# Altium footprint library SMT.PcbLib: 151 footprints (part 9 of 10)
Each footprint in its own frame and in the unit in brackets; x right, y up, seen from the top. Pads: shape width x height; smd on the part's side, far side on the other; paste and mask are expansions set on the pad; w line width, h text height; cw(c..) or ccw(c..) is an arc to the next point about the centre after c.
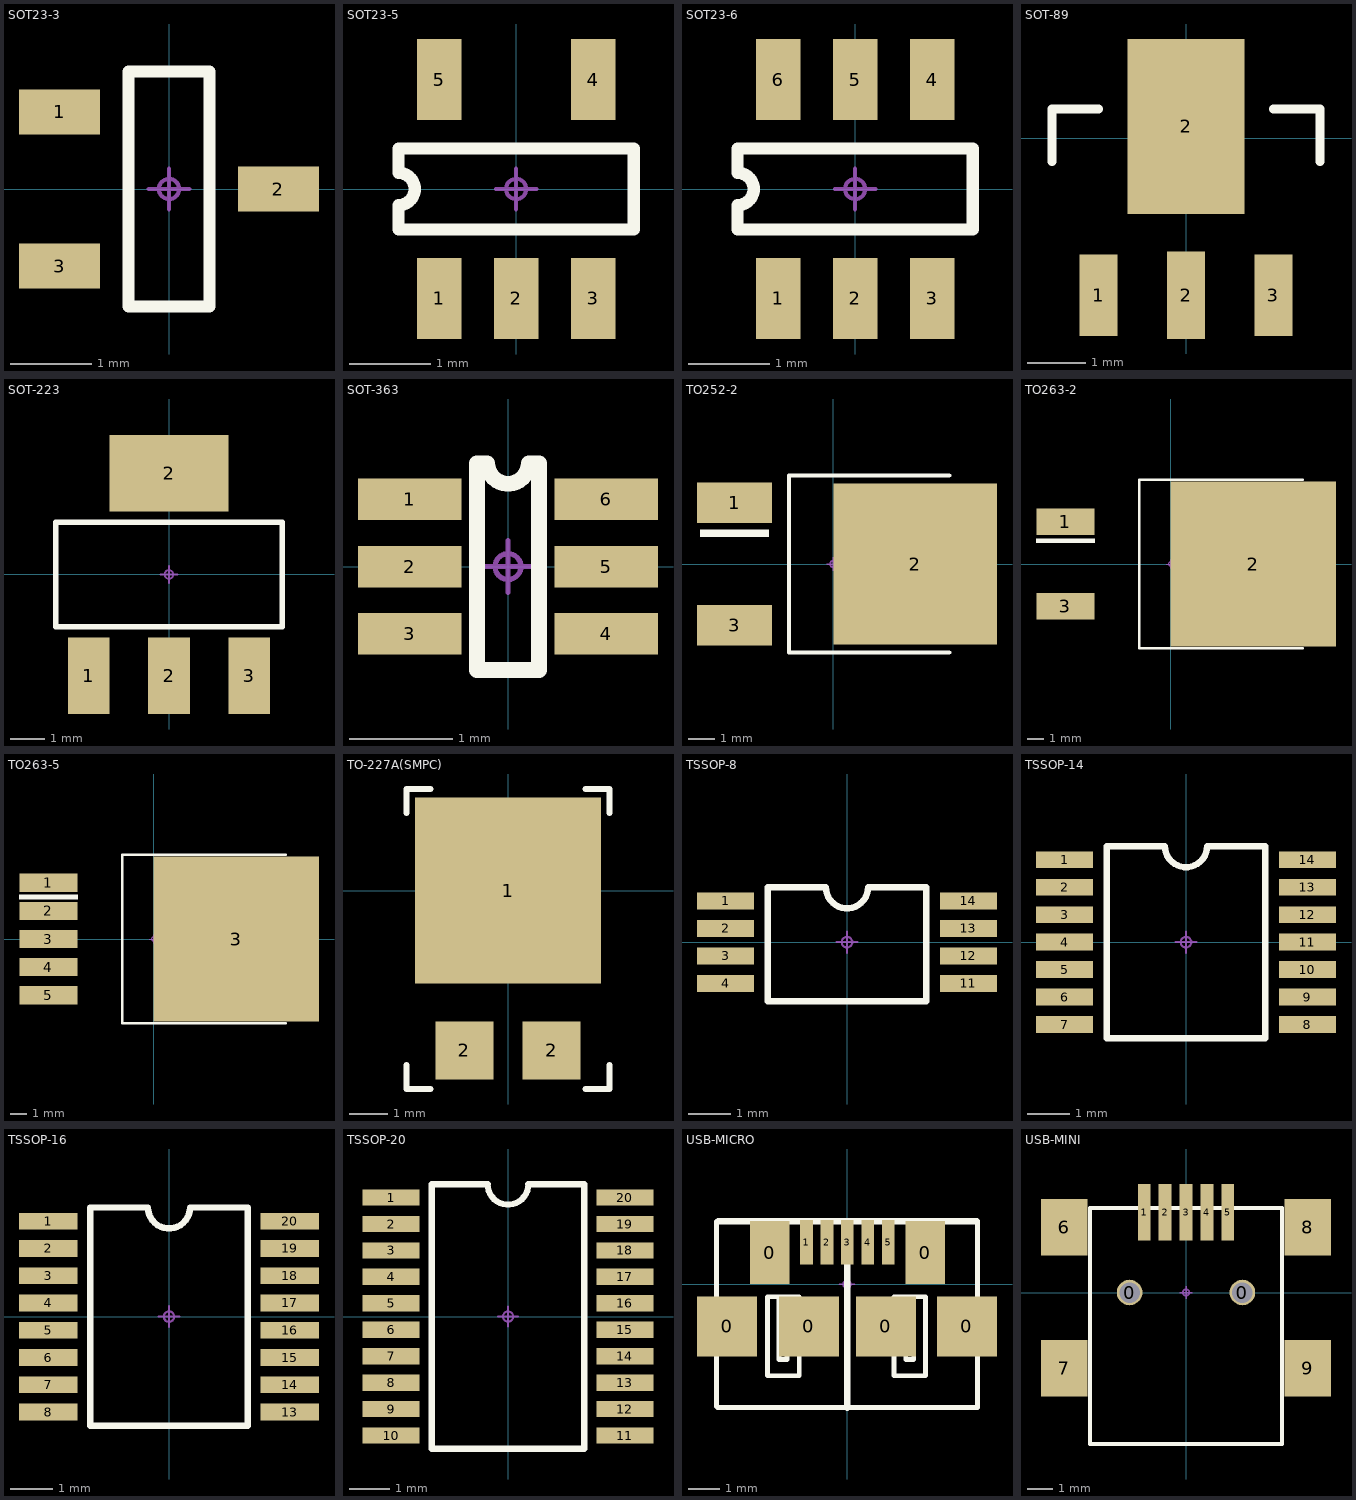
[diagram p8: the footprints below, top view; thin cyan lines are the x and y axes]

## SOT23-3 [mm]
pads (3):
  rect 1x0.55 smd paste-0.02: 1(-1.35,0.95) 2(1.35,0) 3(-1.35,-0.95)
Top Overlay:
  lines w0.152: -0.5,-1.45 0.5,-1.45 0.5,1.45 -0.5,1.45 -0.5,-1.45
Mechanical 15:
  circle w0.05: c0,0 r0.125
  lines w0.05: -0.25,0 0.25,0 ; 0,-0.25 0,0.25
3D body "SW3dPS-sot-3p290x130ll237h100.STEP": height 1, standoff 0, extent -1.16,-1.45 1.21,1.45

## SOT23-5 [mm]
pads (5):
  rect 0.55x1 smd paste-0.02: 1(-0.95,-1.35) 2(0,-1.35) 3(0.95,-1.35) 4(0.95,1.35) 5(-0.95,1.35)
Top Overlay:
  lines w0.152: -1.45,-0.5 -1.45,-0.2 ccw(c-1.45,0) -1.45,0.2 -1.45,0.5 1.45,0.5 1.45,-0.5 -1.45,-0.5
Mechanical 15:
  circle w0.05: c0,0 r0.125
  lines w0.05: -0.25,0 0.25,0 ; 0,-0.25 0,0.25
3D body "User Library-SOT23-5-2.STEP": height 1.45, standoff 0, extent -1.45,-1.4 1.45,1.4

## SOT23-6 [mm]
pads (6):
  rect 0.55x1 smd paste-0.02: 1(-0.95,-1.35) 2(0,-1.35) 3(0.95,-1.35) 4(0.95,1.35) 5(0,1.35) 6(-0.95,1.35)
Top Overlay:
  lines w0.152: -1.45,-0.5 1.45,-0.5 1.45,0.5 -1.45,0.5 -1.45,0.2 cw(c-1.45,0) -1.45,-0.2 -1.45,-0.5
Mechanical 15:
  circle w0.05: c0,0 r0.125
  lines w0.05: -0.25,0 0.25,0 ; 0,-0.25 0,0.25
3D body "SOT23-6.stp": height 1.3, standoff 0, extent -1.5,-1.5 1.5,1.5

## SOT-89 [mm]
pads (4):
  rect 0.65x1.4 smd paste-0.02: 1(-1.5,-2.7) 3(1.5,-2.7)
  rect 0.65x1.5 smd paste-0.02: 2(0,-2.7)
  rect 2x3 smd paste-0.1: 2(0,0.2)
Top Overlay:
  lines w0.152: -2.3,-0.4 -2.3,0.5 -1.5,0.5 ; 1.5,0.5 2.3,0.5 2.3,-0.4
Mechanical 15:
  circle w0.05: c0,0 r0.125
  lines w0.05: -0.25,0 0.25,0 ; 0,-0.25 0,0.25
3D body "SOT-89.STEP": height 1.51, standoff 0, extent -2.25,-3.1 2.25,1.2

## SOT-223 [mm]
pads (4):
  rect 1.2x2.2 smd paste-0.1: 1(-2.3,-2.9) 2(0,-2.9) 3(2.3,-2.9)
  rect 3.4x2.2 smd paste-0.2: 2(0,2.9)
Top Overlay:
  lines w0.152: -3.25,-1.5 3.25,-1.5 3.25,1.5 -3.25,1.5 -3.25,-1.5
Mechanical 15:
  circle w0.05: c0,0 r0.125
  lines w0.05: -0.25,0 0.25,0 ; 0,-0.25 0,0.25
3D body "SOT223-4.STEP": height 1.8, standoff 0, extent -3.35,-3.65 3.35,3.65

## SOT-363 [mm]
pads (6):
  rect 1x0.4 smd: 1(-0.95,0.65) 2(-0.95,0) 3(-0.95,-0.65) 4(0.95,-0.65) 5(0.95,0) 6(0.95,0.65)
Top Overlay:
  lines w0.152: -0.3,-1 0.3,-1 0.3,1 0.2,1 cw(c0,1) -0.2,1 -0.3,1 -0.3,-1
Mechanical 15:
  circle w0.05: c0,0 r0.125
  lines w0.05: -0.25,0 0.25,0 ; 0,-0.25 0,0.25
Mechanical 18:
  text "4" at 1.27,-0.381 h0.64
  text "5" at 1.27,0.254 h0.64
3D body "sot363pad.stp": height 0, standoff 0, extent -1.524,0.434 -0.508,0.866
3D body "sot363pad.stp": height 0, standoff 0, extent -1.524,-0.216 -0.508,0.216
3D body "sot363pad.stp": height 0, standoff 0, extent -1.524,-0.866 -0.508,-0.434
3D body "sot363pad.stp": height 0, standoff 0, extent 0.508,0.434 1.524,0.866
3D body "sot363pad.stp": height 0, standoff 0, extent 0.508,-0.216 1.524,0.216
3D body "sot363pad.stp": height 0, standoff 0, extent 0.508,-0.866 1.524,-0.434
3D body "sot363.stp": height 1.1, standoff -0.01, extent -1.025,-1 1.025,1

## TO252-2 [mm]
height 2.39
pads (3):
  rect 2.8x1.5 smd paste-0.1: 1(-3.683,2.286) 3(-3.683,-2.286)
  rect 6.1x6 smd paste-3.1: 2(3.048,0)
Top Overlay:
  region: -4.953,1.016 -2.413,1.016 -2.413,1.27 -4.953,1.27
  lines w0.152: 4.318,-3.302 -1.651,-3.302 -1.651,3.302 4.318,3.302
Top Paste:
  rectangle: 4,-2.8 5.2,-1.8
  rectangle: 4,-1.3 5.3,-0.3
  rectangle: 4,0.3 5.3,1.3
  rectangle: 4,1.9 5.3,2.9
  rectangle: 2.2,1.9 3.5,2.9
  rectangle: 2.2,0.3 3.5,1.3
  rectangle: 2.2,-1.3 3.5,-0.3
  rectangle: 2.2,-2.8 3.4,-1.8
  rectangle: 0.5,-2.8 1.8,-1.8
  rectangle: 0.5,-1.316 1.8,-0.3
  rectangle: 0.5,1.9 1.8,2.9
  rectangle: 0.5,0.3 1.8,1.3
Mechanical 15:
  circle w0.05: c0,0 r0.125
  lines w0.05: -0.25,0 0.25,0 ; 0,-0.25 0,0.25
3D body "td03b.stp": height 2.48, standoff 0.01, extent -4.122,-3.29 5.577,3.29

## TO263-2 [mm]
height 4.5
pads (3):
  rect 3.5x1.6 smd paste-0.1: 1(-6.35,2.54) 3(-6.35,-2.54)
  rect 10x10 smd paste-5: 2(5,0)
Top Overlay:
  region: -8.128,1.27 -4.572,1.27 -4.572,1.524 -8.128,1.524
  lines w0.152: 8,-5.1 -1.9,-5.1 -1.9,5.1 8,5.1
Top Paste:
  rectangle: 8.4,3.6 9.9,4.6
  rectangle: 8.4,2 9.9,3
  rectangle: 8.4,0.5 9.9,1.5
  rectangle: 8.4,-1.5 9.9,-0.5
  rectangle: 8.4,-3 9.9,-2
  rectangle: 8.4,-4.5 9.9,-3.5
  rectangle: 6.4,-4.5 7.9,-3.5
  rectangle: 6.4,-3 7.9,-2
  rectangle: 6.4,-1.5 7.9,-0.5
  rectangle: 6.4,0.5 7.9,1.5
  rectangle: 6.4,2 7.9,3
  rectangle: 6.4,3.6 7.9,4.6
  rectangle: 4.4,3.6 5.9,4.6
  rectangle: 4.4,2 5.9,3
  rectangle: 4.4,0.5 5.9,1.5
  rectangle: 4.4,-1.5 5.9,-0.5
  rectangle: 4.4,-3 5.9,-2
  rectangle: 4.4,-4.5 5.9,-3.5
  rectangle: 2.4,-4.5 3.9,-3.5
  rectangle: 2.4,-3 3.9,-2
  rectangle: 2.4,-1.5 3.9,-0.5
  rectangle: 2.4,0.5 3.9,1.5
  rectangle: 2.4,2 3.9,3
  rectangle: 2.4,3.6 3.9,4.6
  rectangle: 0.4,3.6 1.9,4.6
  rectangle: 0.4,2 1.9,3
  rectangle: 0.4,-1.5 1.9,-0.5
  rectangle: 0.4,-3 1.9,-2
  rectangle: 0.4,-4.5 1.9,-3.5
  rectangle: 0.4,0.5 1.9,1.5
Mechanical 15:
  circle w0.05: c0,0 r0.125
  lines w0.05: -0.25,0 0.25,0 ; 0,-0.25 0,0.25
3D body "SW3dPS-TO263-3.STEP": height 4.88, standoff 0.08, extent -6.819,-5.055 8.851,4.945

## TO263-5 [mm]
height 4.5
pads (6):
  rect 3.5x1.1 smd: 1(-6.35,3.4) 2(-6.35,1.7) 3(-6.35,0) 4(-6.35,-1.7) 5(-6.35,-3.4)
  rect 10x10 smd paste-5: 3(5,0)
Top Overlay:
  region: -8.128,2.39 -4.572,2.39 -4.572,2.667 -8.128,2.667
  lines w0.152: 8,-5.1 -1.9,-5.1 -1.9,5.1 8,5.1
Top Paste:
  rectangle: 0.4,0.5 1.9,1.5
  rectangle: 0.4,-4.5 1.9,-3.5
  rectangle: 0.4,-3 1.9,-2
  rectangle: 0.4,-1.5 1.9,-0.5
  rectangle: 0.4,2 1.9,3
  rectangle: 0.4,3.6 1.9,4.6
  rectangle: 2.4,3.6 3.9,4.6
  rectangle: 2.4,2 3.9,3
  rectangle: 2.4,0.5 3.9,1.5
  rectangle: 2.4,-1.5 3.9,-0.5
  rectangle: 2.4,-3 3.9,-2
  rectangle: 2.4,-4.5 3.9,-3.5
  rectangle: 4.4,-4.5 5.9,-3.5
  rectangle: 4.4,-3 5.9,-2
  rectangle: 4.4,-1.5 5.9,-0.5
  rectangle: 4.4,0.5 5.9,1.5
  rectangle: 4.4,2 5.9,3
  rectangle: 4.4,3.6 5.9,4.6
  rectangle: 6.4,3.6 7.9,4.6
  rectangle: 6.4,2 7.9,3
  rectangle: 6.4,0.5 7.9,1.5
  rectangle: 6.4,-1.5 7.9,-0.5
  rectangle: 6.4,-3 7.9,-2
  rectangle: 6.4,-4.5 7.9,-3.5
  rectangle: 8.4,-4.5 9.9,-3.5
  rectangle: 8.4,-3 9.9,-2
  rectangle: 8.4,-1.5 9.9,-0.5
  rectangle: 8.4,0.5 9.9,1.5
  rectangle: 8.4,2 9.9,3
  rectangle: 8.4,3.6 9.9,4.6
Mechanical 15:
  circle w0.05: c0,0 r0.125
  lines w0.05: -0.25,0 0.25,0 ; 0,-0.25 0,0.25
3D body "to-263-5.stp": height 4.65, standoff -0.01, extent -6.698,-5.205 5.715,5.205

## TO-227A(SMPC) [mm]
pads (3):
  rect 4.8x4.8 smd paste-0.5: 1(0,0)
  rect 1.5x1.5 smd paste-0.1: 2(-1.125,-4.125) 2(1.125,-4.125)
Top Overlay:
  lines w0.152: -2.625,-4.5 -2.625,-5.125 -2,-5.125 ; -2.625,2 -2.625,2.625 -2,2.625 ; 2,-5.125 2.625,-5.125 2.625,-4.5 ; 2,2.625 2.625,2.625 2.625,2
Mechanical 16:
  circle w0.02: c0,-1.125 r0.125
  lines w0.02: -0.25,-1.125 0.25,-1.125 ; 0,-1.375 0,-0.875
3D body "SW3dPS-TO-277A(SMPC).STEP": height 1.2, standoff 0, extent -2.375,-4.45 2.375,2.2

## TSSOP-8 [mm]
height 1.2
pads (8):
  rect 1.35x0.4 smd paste-0.02: 1(-2.875,0.975) 2(-2.875,0.325) 3(-2.875,-0.325) 4(-2.875,-0.975) 11(2.875,-0.975) 12(2.875,-0.325) 13(2.875,0.325) 14(2.875,0.975)
Top Overlay:
  lines w0.152: -1.875,-1.4 -1.875,1.3 -0.5,1.3 ccw(c0,1.3) 0.5,1.3 1.875,1.3 1.875,-1.4 -1.875,-1.4
Mechanical 15:
  circle w0.05: c0,0 r0.125
  lines w0.05: -0.25,0 0.25,0 ; 0,-0.25 0,0.25
3D body "SW3dPS-MSOP8.STEP": height 1.05, standoff -0.05, extent -2.469,-1.55 2.469,1.55

## TSSOP-14 [mm]
height 1.2
pads (14):
  rect 1.35x0.4 smd paste-0.02: 1(-2.875,1.95) 2(-2.875,1.3) 3(-2.875,0.65) 4(-2.875,0) 5(-2.875,-0.65) 6(-2.875,-1.3) 7(-2.875,-1.95) 8(2.875,-1.95) 9(2.875,-1.3) 10(2.875,-0.65) 11(2.875,0) 12(2.875,0.65) 13(2.875,1.3) 14(2.875,1.95)
Top Overlay:
  lines w0.152: -1.875,-2.275 1.875,-2.275 1.875,2.275 0.5,2.275 cw(c0,2.275) -0.5,2.275 -1.875,2.275 -1.875,-2.275
Mechanical 15:
  circle w0.05: c0,0 r0.125
  lines w0.05: -0.25,0 0.25,0 ; 0,-0.25 0,0.25
3D body "TSSOP14.STEP": height 1.2, standoff 0, extent -3.2,-2.55 3.2,2.55

## TSSOP-16 [mm]
pads (16):
  rect 1.4x0.4 smd: 1(-2.875,2.275) 2(-2.875,1.625) 3(-2.875,0.975) 4(-2.875,0.325) 5(-2.875,-0.325) 6(-2.875,-0.975) 7(-2.875,-1.625) 8(-2.875,-2.275) 13(2.875,-2.275) 14(2.875,-1.625) 15(2.875,-0.975) 16(2.875,-0.325) 17(2.875,0.325) 18(2.875,0.975) 19(2.875,1.625) 20(2.875,2.275)
Top Overlay:
  lines w0.152: -1.875,-2.6 -1.875,2.6 -0.5,2.6 ccw(c0,2.6) 0.5,2.6 1.875,2.6 1.875,-2.6 -1.875,-2.6
Mechanical 15:
  circle w0.05: c0,0 r0.125
  lines w0.05: -0.25,0 0.25,0 ; 0,-0.25 0,0.25
3D body "TSSOP16.step": height 1.09, standoff 0, extent -3.14,-2.5 3.14,2.5

## TSSOP-20 [mm]
pads (20):
  rect 1.4x0.4 smd paste-0.02: 1(-2.875,2.925) 2(-2.875,2.275) 3(-2.875,1.625) 4(-2.875,0.975) 5(-2.875,0.325) 6(-2.875,-0.325) 7(-2.875,-0.975) 8(-2.875,-1.625) 9(-2.875,-2.275) 10(-2.875,-2.925) 11(2.875,-2.925) 12(2.875,-2.275) 13(2.875,-1.625) 14(2.875,-0.975) 15(2.875,-0.325) 16(2.875,0.325) 17(2.875,0.975) 18(2.875,1.625) 19(2.875,2.275) 20(2.875,2.925)
Top Overlay:
  lines w0.15: -0.5,3.25 ccw(c0,3.25) 0.5,3.25
  lines w0.152: -0.5,3.25 -1.875,3.25 -1.875,-3.25 1.875,-3.25 1.875,3.25 0.5,3.25
Mechanical 15:
  circle w0.05: c0,0 r0.125
  lines w0.05: -0.25,0 0.25,0 ; 0,-0.25 0,0.25
3D body "TSSOP-20.STEP": height 1.2, standoff 0, extent -3.276,-3.296 3.274,3.304

## USB-MICRO [mm]
pads (11):
  rect 1.9x1.9 smd: 0(-3.797,-1.333) 0(-1.206,-1.333) 0(1.232,-1.333) 0(3.797,-1.333)
  rect 1.25x2 smd: 0(-2.451,1.003) 0(2.476,1.003)
  rect 0.4x1.4 smd: 1(-1.283,1.333) 2(-0.635,1.333) 3(0.013,1.333) 4(0.66,1.333) 5(1.308,1.333)
Top Overlay:
  lines w0.152: -4.127,-3.873 -4.127,1.994 ; -4.102,-3.899 4.102,-3.899 ; -2.152,-0.394 -2.152,-2.379 -1.949,-2.379 -1.898,-2.379 -1.898,-0.394 ; 1.861,-0.394 1.861,-2.379 2.115,-2.379 2.115,-0.394 ; 4.127,-3.899 4.127,1.994 ; -2.513,-2.894 -2.513,-0.394 -1.513,-0.394 -1.513,-2.894 -2.513,-2.894 ; 1.487,-2.894 2.487,-2.894 2.487,-0.394 1.487,-0.394 1.487,-2.894
  lines w0.2: -4.077,1.994 4.102,1.994 ; 0.013,-3.91 0.013,1.968
Mechanical 15:
  circle w0.05: c0,0 r0.125
  lines w0.05: -0.25,0 0.25,0 ; 0,-0.25 0,0.25
3D body "MICRO USB.STEP": height 2.77, standoff -0.17, extent -4.1,-3.912 4.1,2.018

## USB-MINI [mm]
pads (11):
  round 1 hole 0.8: 0(-2.2,0) 0(2.2,0)
  rect 0.5x2.2 smd: 1(-1.626,3.125) 2(-0.813,3.125) 3(0,3.125) 4(0.813,3.125) 5(1.626,3.125)
  rect 1.8x2.2 smd: 6(-4.75,2.55) 7(-4.75,-2.95) 8(4.75,2.55) 9(4.75,-2.95)
Top Overlay:
  lines w0.152: -3.75,-5.9 3.75,-5.9 3.75,3.3 -3.75,3.3 -3.75,-5.9
Mechanical 15:
  circle w0.05: c0,0 r0.125
  lines w0.05: -0.25,0 0.25,0 ; 0,-0.25 0,0.25
3D body "miniUSB-DIP.STEP": height 3.95, standoff -1, extent -5.35,-5.775 5.35,3.425